# Altium schematic symbol library BARKO_SCHLIB.SchLib: 1064 symbols (part 3 of 11) (continued)
## F-3A1206SlowBlow (continued)
FUSE 3.0A 63VAC/DC SLOW 1206; Manufacturer: Bel; Fuse Type: Board Mount (Cartridge Style Excluded); Current Rating: 3A; Voltage Rating (AC): 63V; DC Cold Resistance: 54mR; Approvals: CE,cURus; Supplier 1: Arrow; Manufacturer Part Number: 0685T3000-01; Stock 1: 25000; Pricing 1: 5000=0,12060, 10000=0,11940, 25000=0,11820, 50000=0,11700, 5000=0,24000, 10000=0,15880, 25000=0,08080, 50000=0,07110, 100000=0,06720 (USD); RoHS: No; Mount: Surface Mount; Case/Package: 1206; Case Code (Imperial): 1206; Case Code (Metric): 3216; Min Operating Temperature: -55°C; Max Operating Temperature: 125°C; Packaging: Tape and Reel; Voltage Rating (DC): 63V; ComponentLink1URL: https://belfuse.com/resources/datasheets/circuitprotection/ds-cp-c1t-series.pdf?src-supplier=Digi-Key; ComponentLink1Description: https://belfuse.com/resources/datasheets/circuitprotection/ds-cp-c1t-series.pdf?src-supplier=Digi-Key; Supplier Part Number 1: 0685T3000-01
footprint L-1206
pins: 1, 2

## F-CER-3.15A AXIAL
designator F?, comment MSG36-PR-3.5A
FUSE CERAMIC 3.15A 250VAC AXIAL; Manufacturer: Schurter; Manufacturer Part Number: 8020.0519.PT; Voltage Rating (AC): 250V; Fuse Type: Cartridge, Ceramic; Approvals: VDE,cURus,CQC,cULus; Washability: OK; .Creator: M.OZKAN; .PCBCHK: USED; Supplier 1: Digi-Key; Stock 1: 3788; Pricing 1: 1=0,48000, 50=0,40000, 100=0,30500, 500=0,23400, 1000=0,20500 (USD); RoHS: Yes; Mount: Through Hole; Case/Package: Axial; Number of Pins: 2; Weight: 0.02187oz; Body Material: Ceramic; Min Operating Temperature: -20°C; Max Operating Temperature: 70°C; Current Rating: 3.15A; Package Quantity: 1000; Packaging: Bulk; Voltage Rating: 250V; Max Voltage Rating (AC): 250V; Termination: Axial; Composition: Ceramic; Fuse Current: 3.15A; Diameter: 3.6mm; Length: 0.433inch; Radiation Hardening: No; REACH SVHC: No SVHC; ComponentLink1URL: https://datasheet.ciiva.com/310/typ-spt-3-6x10-310229.pdf?src-supplier=Digi-Key; ComponentLink1Description: https://datasheet.ciiva.com/310/typ-spt-3-6x10-310229.pdf?src-supplier=Digi-Key; ComponentLink2URL: https://datasheet.ciiva.com/8071/1842600-8071670.pdf?src-supplier=Element14; ComponentLink2Description: https://datasheet.ciiva.com/8071/1842600-8071670.pdf?src-supplier=Element14; ComponentLink3URL: https://datasheet.ciiva.com/8265/typ-spt-3-6x10-8265753.pdf?src-supplier=Avnet; ComponentLink3Description: https://datasheet.ciiva.com/8265/typ-spt-3-6x10-8265753.pdf?src-supplier=Avnet; .SCHCHK: USED
footprint F-AXIAL 4x11MM
pins: 1, 2

## F-PCBA-Barko1275
designator PCBA?, comment Barko_1275
BRK-200-2000021_R000 1275; Manufacturer: BARKO Electronics; Washability: OK; .Creator: M.OZKAN; .PCBCHK: USED; Manufacturer Part Number: BRK-200-2000021_R000; .SCHCHK: USED
footprint BARKO1275 (Barko_1275)
pins: 1 VCC, 2 VCC, 3 VCC, 4 NC, 5 NC, 6 GND, 7 GND, 8 GND, 9 GND, 10 GND, 11 GND, 12 NC, 13 NC, 14 VCC, 15 VCC, 16 VCC, 17 Vcc, 18 Vcc, 19 Vcc, 20 SD_RTN, 21 ~{FLT}, 22 GND, 23 GND, 24 GND, 25 GND, 26 GND, 27 GND, 28 EN_OUT, 29 SD, 30 Vcc, 31 Vcc, 32 Vcc
text: INPUT; OUTPUT

## F-PTC FUSE
designator F?  Trip Current: 3.7A  Case Code (Imperial): 2920
PTC RESET FUSE 33V 1.85A 2920; Manufacturer Part Number: 0ZCF0185FF2C; Manufacturer: Bel; Max Current Rating: 40A; Time to Trip: 2.5s; Resistance: 150mR; Max Power Dissipation: 1.5W; Approvals: cULus,TUV; Color: White; Number of Positions: 2; Connector Type: Male Pin; Pitch: 0.079inch; .Creator: F:TALI; .PCBCHK: USED; Washability: OK; Supplier 1: Digi-Key; Stock 1: 153770; Pricing 1: 1=0.29, 5=0.286, 10=0.273, 50=0.2436, 100=0.2268, 250=0.2016, 500=0.168, 1000=0.1596 (USD); Case Code (Metric): 7351; Package Quantity: 1; Packaging: Tape and Reel; Hold Current: 1.85A; Lead Free: Lead Free; ComponentLink1URL: https://belfuse.com/resources/CircuitProtection/datasheets/0ZCF%20Nov2016.pdf?src-supplier=Digi-Key; ComponentLink1Description: https://belfuse.com/resources/CircuitProtection/datasheets/0ZCF%20Nov2016.pdf?src-supplier=Digi-Key; Supplier Part Number 1: 507-1747-6-ND; Supplier 2: Digi-Key; Stock 2: 41097; Pricing 2: 1=0.81, 5=0.786, 10=0.762, 50=0.6414, 100=0.5324, 250=0.484, 500=0.4114 (USD); Case/Package: 2920; Terminal Material: Copper; Number of Terminals: 2; Min Operating Temperature: -40°C; Max Operating Temperature: 85°C; Voltage Rating: 33V; Current Rating: 40A; Operating Supply Voltage: 33V; Termination: SMD/SMT; Voltage Rating (DC): 33V; Power Dissipation: 1.5W; Power Rating: 1.5W; Length: 7.98mm; Height: 1.25mm; Width: 5.44mm; Terminal Pitch: 8mm; REACH SVHC: No SVHC; ComponentLink2URL: http://www.littelfuse.com/~/media/electronics/datasheets/resettable_ptcs/littelfuse_ptc_2920l_datasheet.pdf.pdf?src-supplier=Digi-Key; ComponentLink2Description: http://www.littelfuse.com/~/media/electronics/datasheets/resettable_ptcs/littelfuse_ptc_2920l_datasheet.pdf.pdf?src-supplier=Digi-Key; ComponentLink3URL: http://uk.rs-online.com/webdocs/1406/0900766b81406484.pdf?src-supplier=RSComponents; ComponentLink3Description: http://uk.rs-online.com/webdocs/1406/0900766b81406484.pdf?src-supplier=RSComponents; ComponentLink4URL: https://www.littelfuse.com/~/media/electronics/datasheets/resettable_ptcs/littelfuse_ptc_2920l_datasheet.pdf.pdf?src-supplier=Digi-Key; ComponentLink4Description: https://www.littelfuse.com/~/media/electronics/datasheets/resettable_ptcs/littelfuse_ptc_2920l_datasheet.pdf.pdf?src-supplier=Digi-Key; ComponentLink5URL: https://www.verical.com/server-webapp/html/getDatasheet?partID=57332&src-supplier=Verical; ComponentLink5Description: https://www.verical.com/server-webapp/html/getDatasheet?partID=57332&src-supplier=Verical; ComponentLink6URL: https://www.distrelec.biz/Web/Downloads/he/et/2920L_eng_datasheet.pdf?mime=application%2Fpdf&src-supplier=Distrelec; ComponentLink6Description: https://www.distrelec.biz/Web/Downloads/he/et/2920L_eng_datasheet.pdf?mime=application%2Fpdf&src-supplier=Distrelec; ComponentLink7URL: http://www.farnell.com/datasheets/1910222.pdf?src-supplier=Element14; ComponentLink7Description: http://www.farnell.com/datasheets/1910222.pdf?src-supplier=Element14; ComponentLink8URL: http://www.farnell.com/datasheets/578244.pdf?src-supplier=Element14; ComponentLink8Description: http://www.farnell.com/datasheets/578244.pdf?src-supplier=Element14; Supplier Part Number 2: F2871DKR-ND; Mount: Through Hole; Contact Plating: Tin; Number of Rows: 1; ComponentLink9URL: http://www1.futureelectronics.com/doc/SULLINS/SWR201-NRTN-SA-WH.pdf?src-supplier=Future+Electronics; ComponentLink9Description: http://www1.futureelectronics.com/doc/SULLINS/SWR201-NRTN-SA-WH.pdf?src-supplier=Future+Electronics; ComponentLink10URL: https://s3.amazonaws.com/catalogspreads-pdf/PAGE128%202mm%20SWR201%20SINGLE%20ROW%20WAFER%20ST%20RA.pdf?src-supplier=Digi-Key; ComponentLink10Description: https://s3.amazonaws.com/catalogspreads-pdf/PAGE128%202mm%20SWR201%20SINGLE%20ROW%20WAFER%20ST%20RA.pdf?src-supplier=Digi-Key; .SCHCHK: USED
footprint F-2920
pins: 1, 2

## F-PTC FUSE 3A
designator F?, comment Termination: Radial  Trip Current: 6A  (hidden comment: 30R300UU)
PTC RESET FUSE 30V 3A RADIAL; Manufacturer: Littelfuse; Power Dissipation: 2W; Current Rating: 40A; Resistance: 80mR; Time to Trip: 10.8s; Approvals: cULus,TUV; .Creator: F:TALI; .PCBCHK: USED; Washability: OK; Supplier 1: Digi-Key; Supplier Part Number 1: F2026-ND; Manufacturer Part Number: 30R300UU; Stock 1: 2309; Pricing 1: 1=0.58, 5=0.562, 10=0.545, 50=0.4584, 100=0.3806, 250=0.346, 500=0.2941, 1000=0.2595, 5000=0.23355 (USD); Case/Package: Radial; Min Operating Temperature: -40°C; Max Operating Temperature: 85°C; Package Quantity: 500; Packaging: Bulk; Operating Supply Voltage: 30V; Max Current Rating: 40A; Max Voltage Rating (DC): 30V; Working Voltage: 30V; Voltage Rating (DC): 30V; Hold Current: 3A; Height: 7.27mm; Width: 11.4mm; Lead Pitch: 5.1mm; Thickness: 3.05mm; Lead Free: Lead Free; REACH SVHC: No SVHC; ComponentLink1URL: http://www.littelfuse.com/~/media/electronics/datasheets/resettable_ptcs/littelfuse_ptc_30r_datasheet.pdf.pdf?src-supplier=Digi-Key; ComponentLink1Description: http://www.littelfuse.com/~/media/electronics/datasheets/resettable_ptcs/littelfuse_ptc_30r_datasheet.pdf.pdf?src-supplier=Digi-Key; ComponentLink2URL: https://www.verical.com/server-webapp/html/getDatasheet?partID=228806&src-supplier=Verical; ComponentLink2Description: https://www.verical.com/server-webapp/html/getDatasheet?partID=228806&src-supplier=Verical; ComponentLink3URL: http://www.farnell.com/datasheets/578253.pdf?src-supplier=Element14; ComponentLink3Description: http://www.farnell.com/datasheets/578253.pdf?src-supplier=Element14; ComponentLink4URL: http://www.farnell.com/datasheets/656941.pdf?src-supplier=Element14; ComponentLink4Description: http://www.farnell.com/datasheets/656941.pdf?src-supplier=Element14; .SCHCHK: USED
footprint Radial 5.1mm Lead (Poly Puse)
pins: 1, 2

## F-PTC-150mA-1206
designator F?, comment Hold Current: 50mA  Case/Package: 1206  (hidden comment: 150mA)
PTC RESET FUSE 60V 50MA 1206; Manufacturer: Bel; Manufacturer Part Number: 0ZCJ0005FF2E; Power Dissipation: 400mW; Max Current Rating: 10A; Time to Trip: 1.5s; Approvals: UL,TUV; Supplier 1: Digi-Key; Supplier Part Number 1: 507-1793-1-ND; Stock: 502454; Pricing: 1=0.11, 5=0.108, 10=0.104, 50=0.0928, 100=0.0864, 250=0.0768, 500=0.064, 1000=0.0608 (USD); RoHS: Yes; Mount: Surface Mount; Case Code (Metric): 3216; Contact Plating: Tin,Matte; Number of Terminals: 2; Case Code (Imperial): 1206; Min Operating Temperature: -40°C; Max Operating Temperature: 85°C; Max Voltage Rating (DC): 60V; Package Quantity: 1; Packaging: Tape and Reel; Trip Current: 150mA; Lead Free: Lead Free; ComponentLink1URL: https://datasheet.ciiva.com/18550/0zcj-18550517.pdf?src-supplier=Digi-Key; ComponentLink1Description: https://datasheet.ciiva.com/18550/0zcj-18550517.pdf?src-supplier=Digi-Key; ComponentLink2URL: https://datasheet.ciiva.com/18550/0zcj-18550518.pdf?src-supplier=Digi-Key; ComponentLink2Description: https://datasheet.ciiva.com/18550/0zcj-18550518.pdf?src-supplier=Digi-Key; ComponentLink3URL: https://datasheet.ciiva.com/18550/0zcj-18550519.pdf?src-supplier=Digi-Key; ComponentLink3Description: https://datasheet.ciiva.com/18550/0zcj-18550519.pdf?src-supplier=Digi-Key
footprint F-1206
pins: 1, 2

## F-PTC-160mA-1206
designator F?, comment 160mA  Case/Package: 1206
PTC RESET FUSE 48V 160MA 1206; Manufacturer: Bel; Manufacturer Part Number: 0ZCJ0016FF2E; Trip Current: 450mA; Time to Trip: 0.3s; Max Current Rating: 10A; Supplier 1: Avnet; Stock 1: 3000; Pricing 1: 3000=0,05539, 6000=0,05364, 12000=0,05112, 18000=0,04968, 24000=0,04788 (USD); RoHS: Yes; Mount: Surface Mount; Case Code (Imperial): 1206; Case Code (Metric): 3216; Contact Plating: Tin,Matte; Min Operating Temperature: -40°C; Max Operating Temperature: 85°C; Package Quantity: 1; Packaging: Tape and Reel; Lead Free: Lead Free; ComponentLink1URL: https://datasheet.ciiva.com/18550/0zcj-18550534.pdf?src-supplier=Digi-Key; ComponentLink1Description: https://datasheet.ciiva.com/18550/0zcj-18550534.pdf?src-supplier=Digi-Key; ComponentLink2URL: https://datasheet.ciiva.com/18550/0zcj-18550535.pdf?src-supplier=Digi-Key; ComponentLink2Description: https://datasheet.ciiva.com/18550/0zcj-18550535.pdf?src-supplier=Digi-Key; ComponentLink3URL: https://datasheet.ciiva.com/18550/0zcj-18550536.pdf?src-supplier=Digi-Key; ComponentLink3Description: https://datasheet.ciiva.com/18550/0zcj-18550536.pdf?src-supplier=Digi-Key; Supplier Part Number 1: 0ZCJ0016FF2E; Hold Current: 160mA
footprint L-1206
pins: 1, 2

## F-PTC-200mA
designator F?, comment Hold Current: 200mA  Case Code (Imperial): 1210  (hidden comment: MF-USMF020-2)
PTC RESET FUSE 30V 200MA 1210; Manufacturer: Bourns; Current Rating: 10A; Resistance: 5R; Power Dissipation: 600mW; Trip Current: 400mA; Time to Trip: 0.02s; Approvals: UL,CSA,TUV; Washability: OK; .Creator: M.OZKAN; .PCBCHK: USED; Supplier 1: Digi-Key; Manufacturer Part Number: MF-USMF020-2; Stock 1: 35052; Pricing 1: 1=0.37000, 5=0.35800, 10=0.34700, 50=0.29160, 100=0.24200, 250=0.22000, 500=0.18700, 1000=0.16500 (USD); RoHS: Yes; Mount: Surface Mount,PCB; Case/Package: 1210; Case Code (Metric): 3225; Number of Terminals: 2; Contact Plating: Gold; Terminal Material: Gold; Min Operating Temperature: -40°C; Max Operating Temperature: 85°C; Packaging: Tape and Reel; Package Quantity: 3000; Voltage Rating (DC): 30V; Max Current Rating: 10A; Operating Supply Voltage: 30V; Voltage Rating: 30V; Termination: SMD/SMT; Voltage Rating (AC): 30V; Length: 3.43mm; Height: 1.1mm; Width: 2.8mm; Radiation Hardening: No; REACH SVHC: No SVHC; Lead Free: Lead Free; ComponentLink1URL: https://datasheet.ciiva.com/34302/1164971-34302049.pdf?src-supplier=Jameco; ComponentLink1Description: https://datasheet.ciiva.com/34302/1164971-34302049.pdf?src-supplier=Jameco; ComponentLink2URL: https://datasheet.ciiva.com/326/mfusmf-326435.pdf?src-supplier=Digi-Key; ComponentLink2Description: https://datasheet.ciiva.com/326/mfusmf-326435.pdf?src-supplier=Digi-Key; ComponentLink3URL: https://datasheet.ciiva.com/326/mfusmf-326436.pdf?src-supplier=Digi-Key; ComponentLink3Description: https://datasheet.ciiva.com/326/mfusmf-326436.pdf?src-supplier=Digi-Key; ComponentLink4URL: https://datasheet.ciiva.com/326/mfusmf-326437.pdf?src-supplier=Digi-Key; ComponentLink4Description: https://datasheet.ciiva.com/326/mfusmf-326437.pdf?src-supplier=Digi-Key; ComponentLink5URL: https://datasheet.ciiva.com/3019/mfusmf-3019685.pdf?src-supplier=Avnet; ComponentLink5Description: https://datasheet.ciiva.com/3019/mfusmf-3019685.pdf?src-supplier=Avnet; ComponentLink6URL: https://datasheet.ciiva.com/8005/mfusmf-8005477.pdf?src-supplier=Element14; ComponentLink6Description: https://datasheet.ciiva.com/8005/mfusmf-8005477.pdf?src-supplier=Element14; ComponentLink7URL: https://datasheet.ciiva.com/3019/mfusmf-3019686.pdf?src-supplier=Avnet; ComponentLink7Description: https://datasheet.ciiva.com/3019/mfusmf-3019686.pdf?src-supplier=Avnet; ComponentLink8URL: https://datasheet.ciiva.com/30081/mfusmf-30081990.pdf?src-supplier=Onlinecomponents.com; ComponentLink8Description: https://datasheet.ciiva.com/30081/mfusmf-30081990.pdf?src-supplier=Onlinecomponents.com; ComponentLink9URL: https://datasheet.ciiva.com/32438/mf-usmf-series-eng-tds-32438758.pdf?src-supplier=Distrelec; ComponentLink9Description: https://datasheet.ciiva.com/32438/mf-usmf-series-eng-tds-32438758.pdf?src-supplier=Distrelec; ComponentLink10URL: https://datasheet.ciiva.com/46433/1869950-46433750.pdf?src-supplier=Element14; ComponentLink10Description: https://datasheet.ciiva.com/46433/1869950-46433750.pdf?src-supplier=Element14; ComponentLink11URL: https://datasheet.ciiva.com/46433/1869950-46433751.pdf?src-supplier=Element14; ComponentLink11Description: https://datasheet.ciiva.com/46433/1869950-46433751.pdf?src-supplier=Element14; ComponentLink12URL: https://datasheet.ciiva.com/22712/48621-22712232.pdf?src-supplier=Element14; ComponentLink12Description: https://datasheet.ciiva.com/22712/48621-22712232.pdf?src-supplier=Element14; ComponentLink13URL: https://datasheet.ciiva.com/14538/70153608-14538687.pdf?src-supplier=Allied+Electronics; ComponentLink13Description: https://datasheet.ciiva.com/14538/70153608-14538687.pdf?src-supplier=Allied+Electronics; Supplier Part Number 1: MF-USMF020-2CT-ND; .SCHCHK: USED
footprint F-1210 (PTC Resettable Fuse, Body 3.215mmx2.575mm, BOURNS MF-USMF Series)
pins: 1, 2

## FB-1K5-0805
designator FB?, comment 1K5  Current Rating: 1A  Case Code (Imperial): 0805
FERRITE BEAD 1.5 KOHM 0805 1LN; Manufacturer: Wurth Electronics; Manufacturer Part Number: 742792097; Tolerance: 25%; Impedance: 1.5kR; DC Resistance (DCR): 300mR; Test Frequency: 100MHz; Number of Lines: 1; Inductance: 1.8nh; .PCBCHK: USED; .Creator: F:TALI; Washability: OK; Supplier 1: Digi-Key; Stock 1: 454; Pricing 1: 1=0.22, 50=0.21, 100=0.193, 500=0.185, 1000=0.176, 2000=0.168 (USD); Mount: Surface Mount; Case/Package: SMD/SMT; Weight: 0.000388oz; Core Material: Ferrite; Case Code (Metric): 2012; Material: Ferrite; Min Operating Temperature: -55°C; Max Operating Temperature: 125°C; Package Quantity: 4000; Packaging: Tape and Reel; Max Current Rating: 1A; Max DC Current: 1A; Termination: SMD/SMT; Length: 2mm; Height: 0.9mm; Width: 1.2mm; Depth: 1.2mm; REACH SVHC: Unknown; Lead Free: Lead Free; ComponentLink1URL: http://www.farnell.com/datasheets/1910964.pdf; ComponentLink1Description: http://www.farnell.com/datasheets/1910964.pdf; ComponentLink2URL: http://www.mouser.com/ds/2/445/742792097-538337.pdf; ComponentLink2Description: http://www.mouser.com/ds/2/445/742792097-538337.pdf; ComponentLink3URL: https://katalog.we-online.de/pbs/datasheet/742792097.pdf; ComponentLink3Description: https://katalog.we-online.de/pbs/datasheet/742792097.pdf; ComponentLink4URL: http://documents.rs-components.com/techlib://itc_doclist_GB.htm?stockno=6694109; ComponentLink4Description: http://documents.rs-components.com/techlib://itc_doclist_GB.htm?stockno=6694109; ComponentLink5URL: http://www.produktinfo.conrad.com/datenblaetter/1000000-1099999/001086987-da-01-ml-WE_CBF_SMD_FERRIT_742792097_de_en.pdf; ComponentLink5Description: http://www.produktinfo.conrad.com/datenblaetter/1000000-1099999/001086987-da-01-ml-WE_CBF_SMD_FERRIT_742792097_de_en.pdf; Supplier Part Number 1: 732-4649-6-ND; .SCHCHK: USED
footprint FB-0805
pins: 1, 2

## FB-1K-0603
designator FB?, comment 1K  Current Rating: 200mA  Case Code (Imperial): 0603
FERRITE BEAD 1 KOHM 0603 1LN; Manufacturer: Laird; Manufacturer Part Number: HZ0603B102R-10; Impedance: 1kR; Number of Lines: 1; DC Resistance (DCR): 600mR; Test Frequency: 100MHz; .PCBCHK: USED; .Creator: F:TALI; Washability: OK; Supplier 1: Digi-Key; Stock 1: 521765; Pricing 1: 1=0.12, 10=0.099, 25=0.0772, 50=0.064, 100=0.0553, 250=0.0442, 500=0.03978, 1000=0.03315 (USD); Mount: Surface Mount; Case/Package: 0603; Weight: 0.002oz; Core Material: Ferrite; Case Code (Metric): 1608; Contact Plating: Matte,Tin; Material: Ferrite; Min Operating Temperature: -40°C; Max Operating Temperature: 125°C; Package Quantity: 1; Packaging: Tape and Reel; Max Current Rating: 200mA; Max DC Current: 200mA; Termination: SMD/SMT; Frequency: 100MHz; Length: 1.6mm; Height: 0.8mm; Width: 0.031inch; Depth: 0.8mm; REACH SVHC: Unknown; Lead Free: Lead Free; ComponentLink1URL: http://lairdtech.thomasnet.com/Asset/HZ0603B102R-10-A-VP.pdf; ComponentLink1Description: http://lairdtech.thomasnet.com/Asset/HZ0603B102R-10-A-VP.pdf; ComponentLink2URL: https://assets.lairdtech.com/home/brandworld/files/HZ0603B102R-10.pdf; ComponentLink2Description: https://assets.lairdtech.com/home/brandworld/files/HZ0603B102R-10.pdf; Supplier Part Number 1: 240-2378-6-ND; .SCHCHK: USED
footprint FB-0603
pins: 1, 2

## FB-1K-0805
designator FB?, comment 1K  Case Code (Imperial): 0805  Current Rating: 500mA
FERRITE BEAD 1 KOHM 0805 1LN; Manufacturer: TDK; Manufacturer Part Number: MMZ2012R102AT000; Impedance: 1kR; Tolerance: 25%; DC Resistance (DCR): 300mR; .PCBCHK: USED; .Creator: F:TALI; Washability: OK; Supplier 1: Digi-Key; Stock 1: 484784; Pricing 1: 1=0.11, 10=0.088, 25=0.0792, 50=0.058, 100=0.0502, 250=0.0396, 500=0.03344, 1000=0.02816 (USD); Mount: Surface Mount; Case/Package: 0805; Core Material: Ferrite; Case Code (Metric): 2012; Packaging: Cut Tape; Package Quantity: 4000; Max DC Current: 500mA; Length: 0.079inch; Height: 0.041inch; Width: 0.049inch; Depth: 1.25mm; REACH SVHC: No SVHC; Lead Free: Lead Free; ComponentLink1URL: http://product.tdk.com/emc/beads/en/documents/beads_commercial_signal_mmz_en.pdf; ComponentLink1Description: http://product.tdk.com/emc/beads/en/documents/beads_commercial_signal_mmz_en.pdf; ComponentLink2URL: https://media.digikey.com/pdf/Data%20Sheets/TDK%20PDFs/MMZ_Series_Br.pdf; ComponentLink2Description: https://media.digikey.com/pdf/Data%20Sheets/TDK%20PDFs/MMZ_Series_Br.pdf; Supplier Part Number 1: 445-1555-6-ND; Supplier 2: Digi-Key; Supplier Part Number 2: 445-1559-6-ND; .SCHCHK: USED
footprint FB-0805
pins: 1, 2

## FB-1K-1206
designator FB?, comment 1K  Max Current Rating: 1A  Case Code (Imperial): 1206
FERRITE BEAD 1 KOHM 1206 1LN; Manufacturer: Wurth Electronics; Manufacturer Part Number: 782763102; Number of Lines: 1; DC Resistance (DCR): 300mR; .PCBCHK: USED; .Creator: F:TALI; Washability: OK; Supplier 1: Digi-Key; Stock 1: 10126; Pricing 1: 1=0.23, 50=0.213, 100=0.188, 500=0.174, 1000=0.157 (USD); Mount: Surface Mount; Case/Package: 1206; Case Code (Metric): 3216; Min Operating Temperature: -55°C; Max Operating Temperature: 125°C; Package Quantity: 3000; Packaging: Tape and Reel; Length: 0.126inch; Height: 0.051inch; Width: 0.063inch; Ratings: AEC-Q200; Supplier Part Number 1: 732-6718-6-ND; .SCHCHK: USED
footprint FB-1206
pins: 1, 2

## FB-2K5-0603
designator FB?, comment 2K5  Current Rating: 50mA  Case Code (Imperial): 0603
FERRITE BEAD 2.5 KOHM 0603 1LN; Manufacturer: Laird; Manufacturer Part Number: HZ0603A252R-10; Impedance: 2.5kR; Number of Lines: 1; DC Resistance (DCR): 1.5R; Test Frequency: 100MHz; .PCBCHK: USED; .Creator: F:TALI; Washability: OK; Supplier 1: Digi-Key; Stock 1: 996357; Pricing 1: 1=0.17, 10=0.14, 25=0.1088, 50=0.0902, 100=0.0778, 250=0.06224, 500=0.05602, 1000=0.04668 (USD); Mount: Surface Mount; Case/Package: 0603; Weight: 0.00201oz; Case Code (Metric): 1608; Material: Ferrite; Contact Plating: Matte,Tin; Core Material: Ferrite; Min Operating Temperature: -40°C; Max Operating Temperature: 125°C; Packaging: Tape and Reel; Package Quantity: 1; Max Current Rating: 50mA; Max DC Current: 50mA; Termination: SMD/SMT; Length: 1.6mm; Height: 0.8mm; Width: 0.031inch; Depth: 0.8mm; REACH SVHC: Unknown; Lead Free: Lead Free; ComponentLink1URL: https://assets.lairdtech.com/home/brandworld/files/HZ0603A252R-10.pdf; ComponentLink1Description: https://assets.lairdtech.com/home/brandworld/files/HZ0603A252R-10.pdf; ComponentLink2URL: http://lairdtech.thomasnet.com/Asset/HZ0603A252R-10-B-VP.pdf; ComponentLink2Description: http://lairdtech.thomasnet.com/Asset/HZ0603A252R-10-B-VP.pdf; ComponentLink3URL: https://www.alliedelec.com/m/d/4ba2e146a83fedf2d77607258fc22628.pdf; ComponentLink3Description: https://www.alliedelec.com/m/d/4ba2e146a83fedf2d77607258fc22628.pdf; Supplier Part Number 1: 240-2561-6-ND; .SCHCHK: USED
footprint FB-0603
pins: 1, 2

## FB-2K5-0805
designator FB?, comment 2K5  Max DC Current: 200mA  Case Code (Imperial): 0805
FERRITE BEAD 2.5 KOHM 0805 1LN; Manufacturer: KEMET; Manufacturer Part Number: Z0805C252DSMST; Impedance: 2.5kR; Tolerance: 25%; Number of Lines: 1; DC Resistance (DCR): 750mR; Test Frequency: 100MHz; .PCBCHK: USED; .Creator: F:TALI; Washability: OK; Supplier 1: Digi-Key; Stock 1: 3510; Pricing 1: 1=0.15, 10=0.126, 25=0.098, 50=0.0814, 100=0.0701, 250=0.05612, 500=0.0505, 1000=0.04208 (USD); Mount: Surface Mount; Case/Package: 0805; Case Code (Metric): 2012; Min Operating Temperature: -55°C; Max Operating Temperature: 125°C; Packaging: Tape and Reel; Package Quantity: 1; Max Current Rating: 200mA; Termination: SMD/SMT; Length: 0.079inch; Height: 0.041inch; Width: 0.049inch; ComponentLink1URL: http://www.kemet.com/Lists/ProductCatalog/Attachments/57/F3115.pdf; ComponentLink1Description: http://www.kemet.com/Lists/ProductCatalog/Attachments/57/F3115.pdf; Supplier Part Number 1: 399-9618-6-ND; .SCHCHK: USED
footprint FB-0805
pins: 1, 2

## FB-30R-0805
designator FB?, comment 30R  Current Rating: 4A  Case Code (Imperial): 0805
FERRITE BEAD 30 OHM 0805 1LN; Manufacturer: Murata; Manufacturer Part Number: BLM21PG300SN1D; Material: Ferrite,Steel; DC Resistance (DCR): 14mR; Max DC Current: 3A; Resistance: 15mR; Tolerance: 25%; Number of Lines: 1; Test Frequency: 100MHz; Shielding: Unshielded; .PCBCHK: USED; .Creator: F:TALI; Washability: OK; Supplier 1: Digi-Key; Stock 1: 192501; Pricing 1: 1=0.11, 10=0.093, 25=0.0724, 50=0.06, 100=0.0517, 250=0.04136, 500=0.03722, 1000=0.03102 (USD); Case/Package: 0805; Number of Pins: 2; Core Material: Ferrite; Case Code (Metric): 2012; Min Operating Temperature: -55°C; Max Operating Temperature: 125°C; Impedance: 30R; Package Quantity: 1; Max Current Rating: 4A; Packaging: Tape and Reel; Termination: SMD/SMT; DC Current: 3A; Military Standard: Not; Frequency: 100MHz; Number of Circuits: 1; Length: 2mm; Height: 0.85mm; Depth: 1.25mm; Width: 1.25mm; Radiation Hardening: No; REACH SVHC: No SVHC; Lead Free: Lead Free; ComponentLink1URL: http://uk.rs-online.com/webdocs/002e/0900766b8002e1f1.pdf; ComponentLink1Description: http://uk.rs-online.com/webdocs/002e/0900766b8002e1f1.pdf; ComponentLink2URL: https://www.murata.com/en-us/products/productdata/8796738977822/ENFA0005.pdf; ComponentLink2Description: https://www.murata.com/en-us/products/productdata/8796738977822/ENFA0005.pdf; ComponentLink3URL: http://search.murata.co.jp/Ceramy/image/img/PDF/ENG/L0110S0100BLM21P.pdf; ComponentLink3Description: http://search.murata.co.jp/Ceramy/image/img/PDF/ENG/L0110S0100BLM21P.pdf; ComponentLink4URL: http://www.murata.com/en-global/api/pdfdownloadapi?cate=luNoiseSupprFilteChipFerriBead&partno=BLM21PG300SN1%23; ComponentLink4Description: http://www.murata.com/en-global/api/pdfdownloadapi?cate=luNoiseSupprFilteChipFerriBead&partno=BLM21PG300SN1%23; ComponentLink5URL: http://www.jameco.com/Jameco/Products/ProdDS/1845339.pdf; ComponentLink5Description: http://www.jameco.com/Jameco/Products/ProdDS/1845339.pdf; ComponentLink6URL: http://www.farnell.com/datasheets/1756152.pdf; ComponentLink6Description: http://www.farnell.com/datasheets/1756152.pdf; ComponentLink7URL: http://www.produktinfo.conrad.com/datenblaetter/1100000-1199999/001172365-da-01-en-DROSSEL_0805_30R0_2_0X1_25MM_4000ST.pdf; ComponentLink7Description: http://www.produktinfo.conrad.com/datenblaetter/1100000-1199999/001172365-da-01-en-DROSSEL_0805_30R0_2_0X1_25MM_4000ST.pdf; Supplier Part Number 1: 490-1052-6-ND; .SCHCHK: USED
footprint FB-0805
pins: 1, 2

## FB-30R-0805_1
designator FB?, comment 30R  Current Rating: 1.5A  Case Code (Imperial): 0805
FERRITE BEAD 30 OHM 0805 1LN; Manufacturer: TDK; Manufacturer Part Number: MMZ2012R300AT000; Tolerance: 25%; DC Resistance (DCR): 50mR; .PCBCHK: USED; .Creator: F:TALI; Washability: OK; Supplier 1: Digi-Key; Stock 1: 7529; Pricing 1: 1=0.11, 10=0.088, 25=0.0792, 50=0.058, 100=0.0502, 250=0.0396, 500=0.03344, 1000=0.02816 (USD); Mount: Surface Mount; Case/Package: 0805; Case Code (Metric): 2012; Core Material: Ferrite; Impedance: 30R; Package Quantity: 4000; Packaging: Tape and Reel; Max DC Current: 1.5A; Length: 0.079inch; Height: 0.041inch; Width: 0.049inch; Depth: 1.25mm; REACH SVHC: No SVHC; ComponentLink1URL: http://product.tdk.com/emc/beads/en/documents/beads_commercial_signal_mmz_en.pdf; ComponentLink1Description: http://product.tdk.com/emc/beads/en/documents/beads_commercial_signal_mmz_en.pdf; ComponentLink2URL: https://media.digikey.com/pdf/Data%20Sheets/TDK%20PDFs/MMZ_Series_Br.pdf; ComponentLink2Description: https://media.digikey.com/pdf/Data%20Sheets/TDK%20PDFs/MMZ_Series_Br.pdf; ComponentLink3URL: http://product.tdk.com/en/catalog/datasheets/beads_commercial_signal_mmz_en.pdf; ComponentLink3Description: http://product.tdk.com/en/catalog/datasheets/beads_commercial_signal_mmz_en.pdf; Supplier Part Number 1: 445-2199-6-ND; .SCHCHK: USED
footprint FB-0805
pins: 1, 2

## FB-33R-0603
designator FB?, comment 33R  Current Rating: 3A  Case Code (Imperial): 0603
FERRITE BEAD 33 OHM 0603 1LN; Manufacturer: Murata; Manufacturer Part Number: BLM18PG330SN1D; Material: Ferrite,Steel; Resistance: 25mR; Tolerance: 25%; Number of Lines: 1; Test Frequency: 100MHz; Shielding: Unshielded; .PCBCHK: USED; .Creator: F:TALI; Washability: OK; Supplier 1: Digi-Key; Stock 1: 113499; Pricing 1: 1=0.1, 10=0.076, 25=0.0684, 50=0.05, 100=0.0433, 250=0.03416, 500=0.02884, 1000=0.02429 (USD); Case/Package: 0603; Number of Pins: 2; Core Material: Ferrite; Case Code (Metric): 1608; Min Operating Temperature: -55°C; Max Operating Temperature: 125°C; Package Quantity: 1; Impedance: 33R; Packaging: Tape and Reel; ESR (Equivalent Series Resistance): 33R; Max Current Rating: 3A; DC Resistance (DCR): 25mR; Max DC Current: 3A; Termination: SMD/SMT; DC Current: 3A; Number of Circuits: 1; Length: 1.6mm; Height: 0.8mm; Width: 0.8mm; Depth: 0.8mm; Radiation Hardening: No; REACH SVHC: No SVHC; Lead Free: Lead Free; ComponentLink1URL: https://www.murata.com/en-us/products/productdata/8796738650142/ENFA0003.pdf; ComponentLink1Description: https://www.murata.com/en-us/products/productdata/8796738650142/ENFA0003.pdf; ComponentLink2URL: http://www.farnell.com/datasheets/5148.pdf; ComponentLink2Description: http://www.farnell.com/datasheets/5148.pdf; ComponentLink3URL: http://uk.rs-online.com/webdocs/13ec/0900766b813ecf52.pdf; ComponentLink3Description: http://uk.rs-online.com/webdocs/13ec/0900766b813ecf52.pdf; ComponentLink4URL: http://search.murata.co.jp/Ceramy/image/img/PDF/ENG/L0110S0100BLM18P.pdf; ComponentLink4Description: http://search.murata.co.jp/Ceramy/image/img/PDF/ENG/L0110S0100BLM18P.pdf; ComponentLink5URL: http://www.jameco.com/Jameco/Products/ProdDS/1845056.pdf; ComponentLink5Description: http://www.jameco.com/Jameco/Products/ProdDS/1845056.pdf; Supplier Part Number 1: 490-5220-6-ND; .SCHCHK: USED
footprint FB-0603
pins: 1, 2

## FB-100R-0603
designator FB?, comment 100R  Current Rating: 3A  Case Code (Imperial): 0603
FERRITE BEAD 100 OHM 0603 1LN; Manufacturer: TDK; Manufacturer Part Number: MPZ1608S101ATAH0; Tolerance: 25%; DC Resistance (DCR): 30mR; .PCBCHK: USED; .Creator: F:TALI; Washability: OK; Supplier 1: Digi-Key; Stock 1: 605161; Pricing 1: 1=0.1, 10=0.079, 25=0.0716, 50=0.0644, 100=0.0472, 250=0.03432, 500=0.03146, 1000=0.02717 (USD); Mount: Surface Mount; Case/Package: 0603; Case Code (Metric): 1608; Core Material: Ferrite; Impedance: 100R; Packaging: Tape and Reel; Package Quantity: 4000; Max DC Current: 3A; Length: 0.063inch; Height: 0.03inch; Width: 0.031inch; Depth: 0.8mm; REACH SVHC: No SVHC; ComponentLink1URL: https://media.digikey.com/pdf/Data%20Sheets/TDK%20PDFs/MPZ_Series_Br.pdf; ComponentLink1Description: https://media.digikey.com/pdf/Data%20Sheets/TDK%20PDFs/MPZ_Series_Br.pdf; ComponentLink2URL: http://product.tdk.com/en/catalog/datasheets/beads_commercial_power_mpz_en.pdf; ComponentLink2Description: http://product.tdk.com/en/catalog/datasheets/beads_commercial_power_mpz_en.pdf; Supplier Part Number 1: 445-1564-6-ND; .SCHCHK: USED
footprint FB-0603
pins: 1, 2

## FB-120R-0402
designator FB?, comment 120R  Current Rating: 1A  Case Code (Imperial): 0402
FERRITE BEAD 120 OHM 0402 1LN; Manufacturer: Taiyo Yuden; Manufacturer Part Number: BKP1005HS121-T; Tolerance: 25%; Number of Lines: 1; DC Resistance (DCR): 140mR; Test Frequency: 100MHz; Shielding: Unshielded; .PCBCHK: USED; .Creator: F:TALI; Washability: OK; Supplier 1: Digi-Key; Stock 1: 1519586; Pricing 1: 1=0.1, 10=0.041, 25=0.0364, 50=0.033, 100=0.0297, 250=0.0218, 500=0.01584, 1000=0.01551, 5000=0.01056 (USD); Mount: Surface Mount; Case/Package: 0402; Number of Pins: 2; Case Code (Metric): 1005; Core Material: Ferrite; Min Operating Temperature: -55°C; Max Operating Temperature: 85°C; Packaging: Tape and Reel; Impedance: 120R; Package Quantity: 1; Max Current Rating: 1A; Max DC Current: 1A; Termination: SMD/SMT; Length: 0.039inch; Height: 0.5mm; Width: 0.02inch; Depth: 0.5mm; Halogen Free: Halogen Free; Lead Free: Lead Free; REACH SVHC: Unknown; ComponentLink1URL: http://www.farnell.com/datasheets/1929896.pdf; ComponentLink1Description: http://www.farnell.com/datasheets/1929896.pdf; ComponentLink2URL: http://www.onlinecomponents.com/productFiles/mf-TAI/mlci08_e.pdf; ComponentLink2Description: http://www.onlinecomponents.com/productFiles/mf-TAI/mlci08_e.pdf; ComponentLink3URL: http://ds.yuden.co.jp/TYCOMPAS/ut/detail.do?productNo=BKP1005HS121-T&fileName=BKP1005HS121-T_SS&mode=specSheetDownload; ComponentLink3Description: http://ds.yuden.co.jp/TYCOMPAS/ut/detail.do?productNo=BKP1005HS121-T&fileName=BKP1005HS121-T_SS&mode=specSheetDownload; Supplier Part Number 1: 587-1921-6-ND; .SCHCHK: USED
footprint FB-0402
pins: 1, 2

## FB-120R-0603
designator FB?, comment 120R  Max DC Current: 2.7A  Case Code (Imperial): 0603
FERRITE BEAD 120 OHM 0603 1LN; Manufacturer: Taiyo Yuden; Manufacturer Part Number: BKP1608HS121-T; Tolerance: 25%; DC Resistance (DCR): 35mR; Test Frequency: 100MHz; Number of Lines: 1; Shielding: Unshielded; .PCBCHK: USED; .Creator: F:TALI; Washability: OK; Supplier 1: Digi-Key; Stock 1: 519854; Pricing 1: 1=0.1, 10=0.059, 25=0.052, 50=0.0474, 100=0.0426, 250=0.0312, 500=0.0227, 1000=0.02223 (USD); Mount: Surface Mount; Case/Package: 0603; Case Code (Metric): 1608; Core Material: Ferrite; Min Operating Temperature: -55°C; Max Operating Temperature: 85°C; Packaging: Tape and Reel; Package Quantity: 1; Termination: SMD/SMT; Max Current Rating: 2.7A; Impedance: 120R; Self Resonant Frequency: 100MHz; Length: 1.6mm; Height: 0.8mm; Width: 0.8mm; Depth: 1.6mm; Lead Free: Lead Free; REACH SVHC: Unknown; Halogen Free: Halogen Free; ComponentLink1URL: http://www.farnell.com/datasheets/1926569.pdf; ComponentLink1Description: http://www.farnell.com/datasheets/1926569.pdf; ComponentLink2URL: http://documents.rs-components.com/techlib://itc_doclist_GB.htm?stockno=7555639; ComponentLink2Description: http://documents.rs-components.com/techlib://itc_doclist_GB.htm?stockno=7555639; ComponentLink3URL: http://ds.yuden.co.jp/TYCOMPAS/ut/detail.do?productNo=BKP1608HS121-T&fileName=BKP1608HS121-T_SS&mode=specSheetDownload; ComponentLink3Description: http://ds.yuden.co.jp/TYCOMPAS/ut/detail.do?productNo=BKP1608HS121-T&fileName=BKP1608HS121-T_SS&mode=specSheetDownload; ComponentLink4URL: http://www.onlinecomponents.com/productFiles/mf-TAI/mlci08_e.pdf; ComponentLink4Description: http://www.onlinecomponents.com/productFiles/mf-TAI/mlci08_e.pdf; ComponentLink5URL: http://www.yuden.co.jp/productdata/catalog/en/mlci08_e.pdf; ComponentLink5Description: http://www.yuden.co.jp/productdata/catalog/en/mlci08_e.pdf; Supplier Part Number 1: 587-1923-6-ND; .SCHCHK: USED
footprint FB-0603
pins: 1, 2

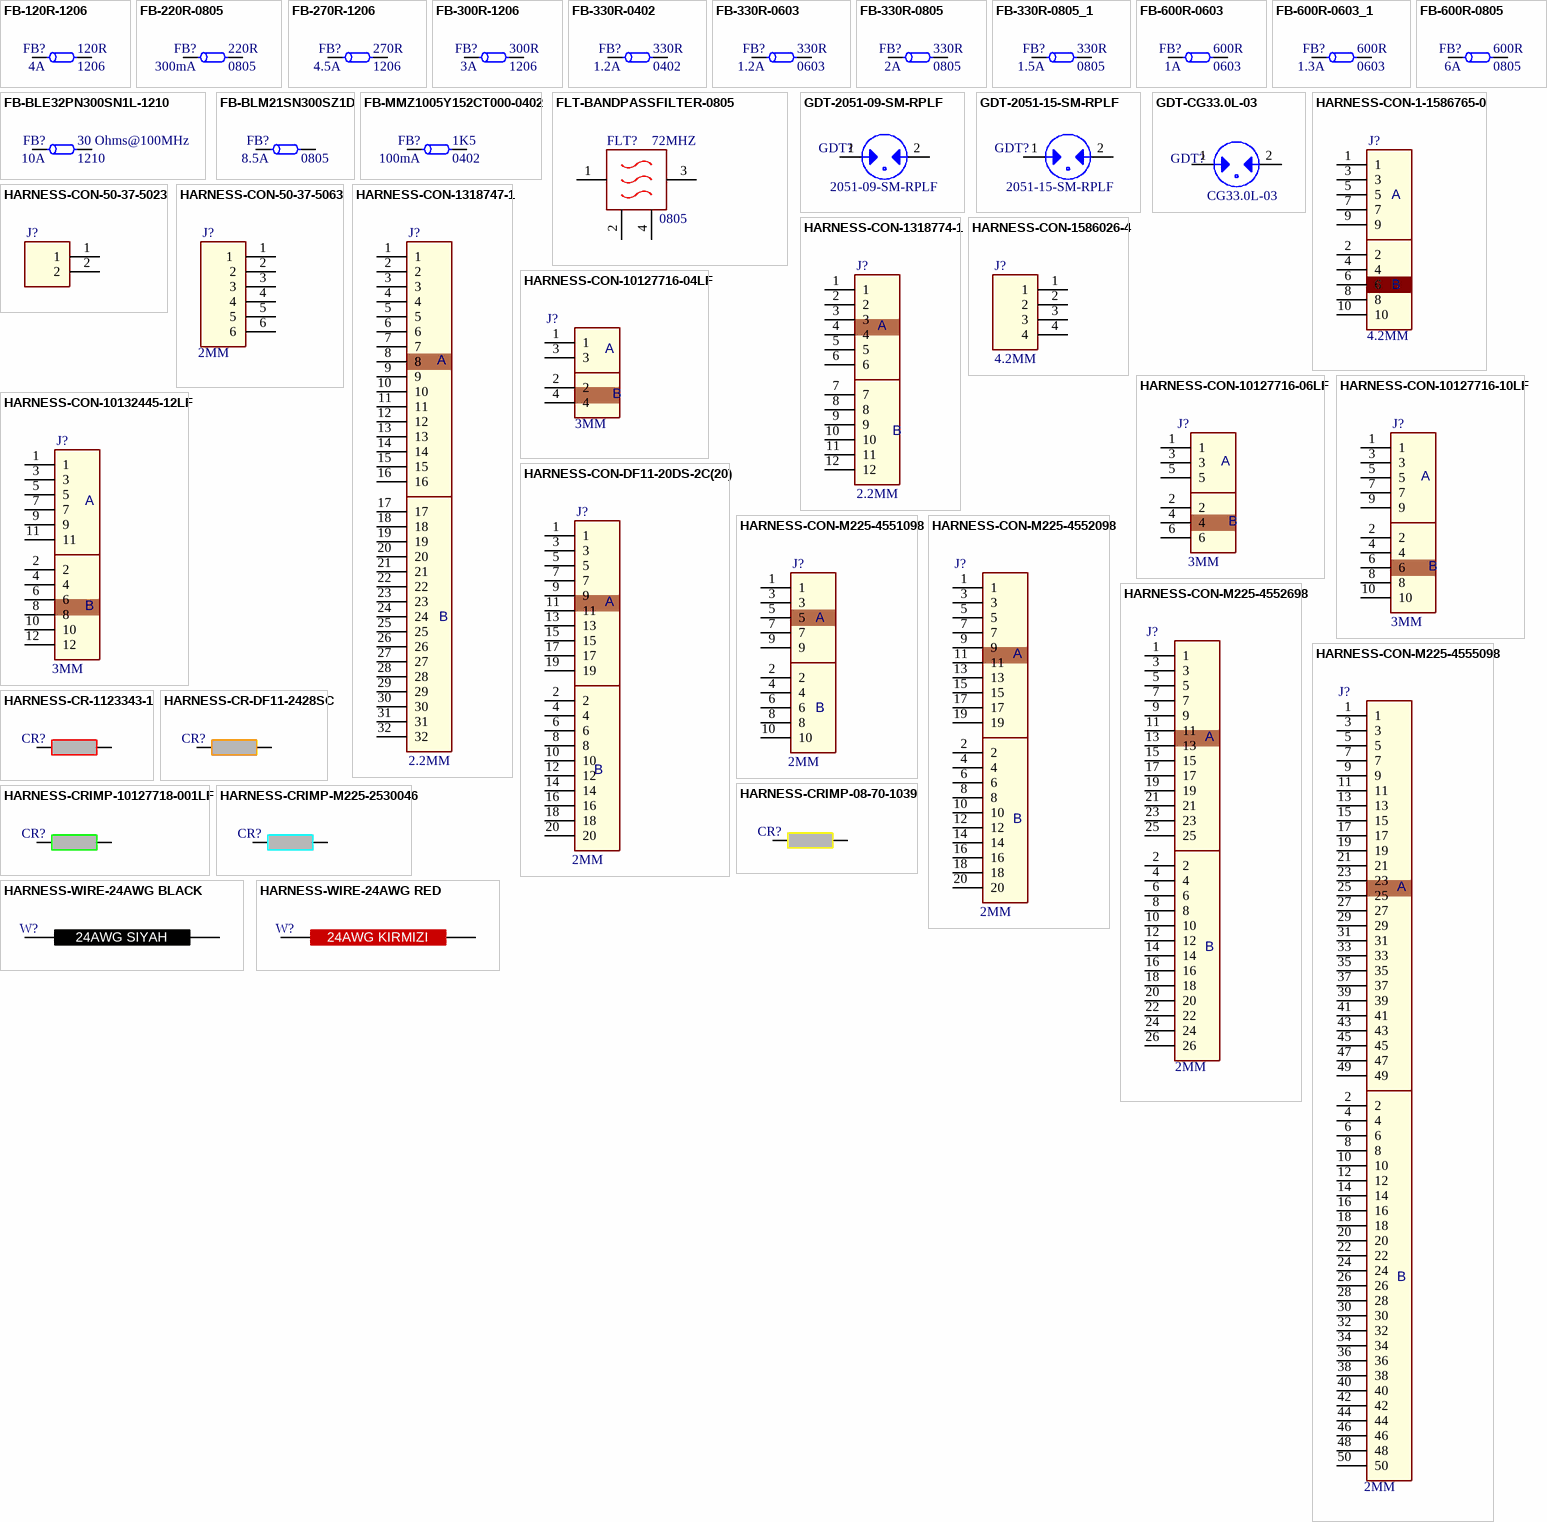
[diagram p11: symbols FB-120R-1206 to HARNESS-WIRE-24AWG RED]

## FB-120R-1206
designator FB?, comment 120R  Current Rating: 4A  Case Code (Imperial): 1206
FERRITE BEAD 120 OHM 1206 1LN; Manufacturer: Laird; Manufacturer Part Number: HI1206P121R-10; DC Resistance (DCR): 30mR; Number of Lines: 1; Test Frequency: 100MHz; .PCBCHK: USED; .Creator: F:TALI; Washability: OK; Supplier 1: Digi-Key; Stock 1: 375681; Pricing 1: 1=0.18, 10=0.15, 25=0.1164, 50=0.0966, 100=0.0833, 250=0.0666, 500=0.05994, 1000=0.04995 (USD); Mount: Surface Mount; Case/Package: 1206; Weight: 0.000944oz; Case Code (Metric): 3216; Core Material: Ferrite; Material: Ferrite; Contact Plating: Matte,Tin; Min Operating Temperature: -40°C; Max Operating Temperature: 125°C; Package Quantity: 1; Packaging: Tape and Reel; Max Current Rating: 4A; Impedance: 120R; Max DC Current: 4A; Termination: SMD/SMT; Frequency: 100MHz; Length: 3.2mm; Height: 0.051inch; Width: 1.6mm; Depth: 1.8mm; REACH SVHC: Unknown; Lead Free: Lead Free; ComponentLink1URL: http://assets.lairdtech.com/home/brandworld/files/HI1206P121R-10.pdf; ComponentLink1Description: http://assets.lairdtech.com/home/brandworld/files/HI1206P121R-10.pdf; ComponentLink2URL: http://www.farnell.com/datasheets/1685744.pdf; ComponentLink2Description: http://www.farnell.com/datasheets/1685744.pdf; ComponentLink3URL: http://lairdtech.thomasnet.com/Asset/HI1206P121R-10-A-VP.pdf; ComponentLink3Description: http://lairdtech.thomasnet.com/Asset/HI1206P121R-10-A-VP.pdf; Supplier Part Number 1: 240-2410-6-ND; .SCHCHK: USED
footprint FB-1206
pins: 1, 2

## FB-220R-0805
designator FB?, comment 220R  Case Code (Imperial): 0805  Current Rating: 300mA
FERRITE BEAD 220 OHM 0805 1LN; Manufacturer: Wurth Electronics; Manufacturer Part Number: 742792034; Tolerance: 25%; Number of Lines: 1; DC Resistance (DCR): 300mR; Test Frequency: 100MHz; Inductance: 0.47h; .PCBCHK: USED; .Creator: F:TALI; Washability: OK; Supplier 1: Digi-Key; Stock 1: 4155; Pricing 1: 1=0.2, 50=0.196, 100=0.18, 500=0.172, 1000=0.165, 2000=0.157 (USD); Mount: Surface Mount; Case/Package: SMD/SMT; Weight: 0.000388oz; Case Code (Metric): 2012; Core Material: Ferrite; Material: Ferrite; Min Operating Temperature: -55°C; Max Operating Temperature: 125°C; Package Quantity: 1; Packaging: Tape and Reel; Max Current Rating: 300mA; Max DC Current: 300mA; Termination: SMD/SMT; Resistance: 300mR; Length: 2mm; Height: 0.9mm; Width: 0.047inch; Depth: 1.2mm; REACH SVHC: Unknown; Lead Free: Lead Free; ComponentLink1URL: http://www.farnell.com/datasheets/1696024.pdf; ComponentLink1Description: http://www.farnell.com/datasheets/1696024.pdf; ComponentLink2URL: https://katalog.we-online.de/pbs/datasheet/742792034.pdf; ComponentLink2Description: https://katalog.we-online.de/pbs/datasheet/742792034.pdf; ComponentLink3URL: http://www.farnell.com/datasheets/1919977.pdf; ComponentLink3Description: http://www.farnell.com/datasheets/1919977.pdf; ComponentLink4URL: http://documents.rs-components.com/techlib://itc_doclist_GB.htm?stockno=6694064; ComponentLink4Description: http://documents.rs-components.com/techlib://itc_doclist_GB.htm?stockno=6694064; ComponentLink5URL: https://www.distrelec.biz/Web/Downloads/_t/ds/742792034_eng_tds.pdf?mime=application%2Fpdf; ComponentLink5Description: https://www.distrelec.biz/Web/Downloads/_t/ds/742792034_eng_tds.pdf?mime=application%2Fpdf; ComponentLink6URL: http://www.mouser.com/ds/2/445/742792034-538623.pdf; ComponentLink6Description: http://www.mouser.com/ds/2/445/742792034-538623.pdf; Supplier Part Number 1: 732-1602-6-ND; Impedance: 220R; .SCHCHK: USED
footprint FB-0805
pins: 1, 2

## FB-270R-1206
designator FB?, comment 270R  Case Code (Imperial): 1206  Current Rating: 4.5A
FERRITE BEAD 270 OHM 1206 1LN; Manufacturer: Murata; Manufacturer Part Number: BLM31KN271SZ1L; .PCBCHK: USED; .Creator: F:TALI; Washability: OK; Supplier 1: Digi-Key; Stock 1: 2294; Pricing 1: 1=0.32, 10=0.253, 25=0.214, 50=0.1882, 100=0.1683, 250=0.14652, 500=0.13266, 1000=0.11286 (USD); Supplier Part Number 1: 490-16528-6-ND; .SCHCHK: USED
footprint FB-1206
pins: 1, 2